# Altium footprint library 3.Inductors&Transformers.PcbLib: 51 footprints (part 1 of 4)
Each footprint in its own frame and in the unit in brackets; x right, y up, seen from the top. Pads: shape width x height; smd on the part's side, far side on the other; paste and mask are expansions set on the pad; w line width, h text height; cw(c..) or ccw(c..) is an arc to the next point about the centre after c.
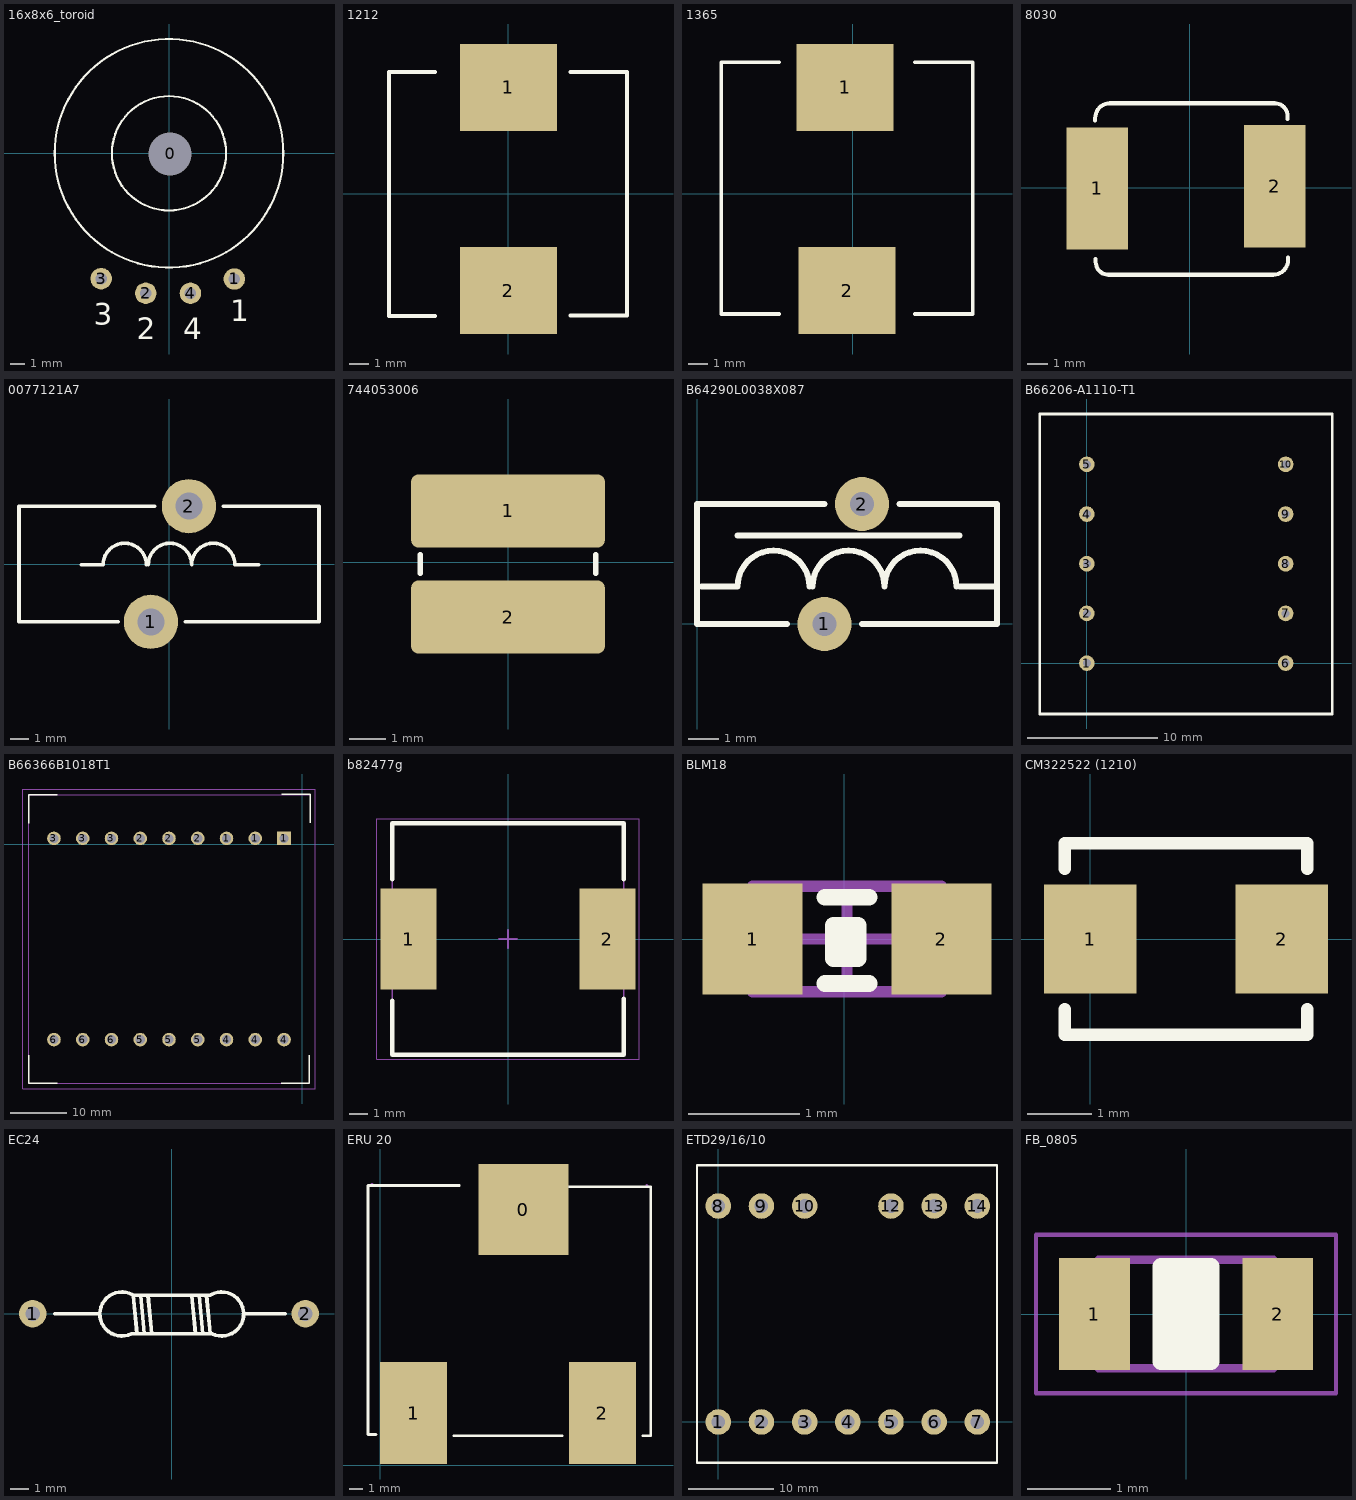
[diagram p0: the footprints below, top view; thin cyan lines are the x and y axes]

## 16x8x6_toroid [mm]
pads (5):
  round 1.5 hole 3: 0(0.075,-0.05)
  round 1.5 hole 0.8: 1(4.575,-8.8) 2(-1.625,-9.8) 3(-4.75,-8.775) 4(1.5,-9.8)
Top Overlay:
  circle w0.15: c0,0 r4
  circle w0.15: c0,0 r8
  text "4" at 1,-13 h1.5
  text "3" at -5.275,-12 h1.5
  text "2" at -2.25,-13 h1.5
  text "1" at 4.3,-11.775 h1.5

## 1212 [mm]
pads (2):
  rect 5x4.5 smd: 1(0,5.5) 2(0,-5)
Top Overlay:
  lines w0.2: -3.8,-6.305 -6.176,-6.305 -6.176,6.3 -3.8,6.3 ; 3.2,-6.295 6.134,-6.295 6.134,6.3 3.2,6.3
3D body "SUMIDA-CDRH127.step": height 7.5, standoff 0.05, extent -6,-6.171 6,6.171

## 1365 [mm]
pads (2):
  rect 5x4.5 smd: 1(-0.4,5.5) 2(-0.3,-5)
Top Overlay:
  lines w0.2: -3.8,-6.2 -6.8,-6.2 -6.8,6.8 -3.8,6.8 ; 3.2,-6.2 6.2,-6.2 6.2,6.8 3.2,6.8
3D body "User Library-744355047.STEP": height 4.72, standoff -0.09, extent -6.7,-6.1 6.1,6.9

## 8030 [mm]
pads (2):
  rect 3x6 smd: 1(-4.525,-0.025) 2(4.175,0.075)
Top Overlay:
  lines w0.2: -4.625,3.3 -4.625,3.425 cw(c-3.9,3.425) -3.9,4.15 4.175,4.15 cw(c4.175,3.525) 4.8,3.525 4.8,3.375 ; -4.6,-3.475 -4.6,-3.625 ccw(c-3.975,-3.625) -3.975,-4.25 4.1,-4.25 ccw(c4.1,-3.525) 4.825,-3.525 4.825,-3.4
3D body "STEP-WE-LHMI-8030-rev1.stp": height 3.05, standoff 0.05, extent -4.625,-4.025 4.825,4.175

## 0077121A7 [mm]
pads (2):
  round 3 hole 1.5: 1(-1,-3.2) 2(1.1,3.2)
Top Overlay:
  lines w0.2: -4.85,-0.05 -3.65,-0.05 cw(c-2.45,-0.05) -1.25,-0.05 ; -2.8,-3.2 -8.3,-3.2 -8.3,3.2 -0.8,3.2 ; -1.15,-0.05 cw(c0.05,-0.05) 1.25,-0.05 cw(c2.45,-0.05) 3.65,-0.05 ; 0.9,-3.2 8.3,-3.2 8.3,3.2 3,3.2 ; 3.75,-0.05 4.95,-0.05

## 744053006 [mm] "WE-TPC SMD Shielded Tiny Power Inductor"
pads (2):
  rrect20% 5.3x2 smd: 1(0,1.4) 2(0,-1.5)
Top Overlay:
  lines w0.15: -2.4,-0.3 -2.4,0.2 ; 2.4,-0.3 2.4,0.2
3D body: height 1.9, standoff 0, extent -2.4,-2.45 2.4,2.35

## B64290L0038X087 [mm]
pads (2):
  round 1.8 hole 0.8: 1(4.25,0) 2(5.5,4)
Top Overlay:
  lines w0.2: 0.15,1.25 1.35,1.25 cw(c2.55,1.25) 3.75,1.25 ; 1.35,2.95 8.75,2.95 ; 3,0 0,0 0,4 4.25,4 ; 3.85,1.25 cw(c5.05,1.25) 6.25,1.25 cw(c7.45,1.25) 8.65,1.25 ; 5.5,0 10,0 10,4 6.75,4 ; 8.75,1.25 9.95,1.25
3D body "B64290L0038X087.stp": height 10.99, standoff 1.01, extent 0,0.01 10,3.99

## B66206-A1110-T1 [mm]
pads (10):
  round 1.2 hole 0.6: 1(0,0) 2(0,3.81) 3(0,7.62) 4(0,11.43) 5(0,15.24) 6(15.24,0) 7(15.24,3.81) 8(15.24,7.62) 9(15.24,11.43) 10(15.24,15.24)
Top Overlay:
  lines w0.2: -3.6,-3.9 -3.6,19.1 18.8,19.1 18.8,-3.9 -3.6,-3.9
3D body "User Library-Ensamblaje.STEP": height 16.72, standoff -3.48, extent -3.638,-3.9 18.838,19.117

## B66366B1018T1 [mm]
pads (18):
  round 2.4 hole 1.6: 1(-13.36,1) 1(-8.28,1) 2(-28.6,1) 2(-23.52,1) 2(-18.44,1) 3(-43.84,1) 3(-38.76,1) 3(-33.68,1) 4(-13.36,-34.56) 4(-8.28,-34.56) 4(-3.2,-34.56) 5(-28.6,-34.56) 5(-23.52,-34.56) 5(-18.44,-34.56) 6(-43.84,-34.56) 6(-38.76,-34.56) 6(-33.68,-34.56)
  rect 2.4x2.4 hole 1.6: 1(-3.2,1)
Top Overlay:
  lines w0.254: -48.3,-37.3 -48.3,-42.3 -43.3,-42.3 ; -48.3,3.7 -48.3,8.7 -43.3,8.7 ; -3.72,-42.28 1.28,-42.28 1.28,-37.28 ; -3.6,8.8 1.4,8.8 1.4,3.8
Mechanical 13:
  lines w0.1: 1.28,-42.28 -48.32,-42.28 -48.32,8.72 1.28,8.72
Mechanical 15:
  lines w0.1: -49.32,-43.28 -49.32,9.72 2.28,9.72 2.28,-43.28 -49.32,-43.28
3D body "B66366B1018T1.stp": height 38.08, standoff -4.5, extent -48.261,-42.2 1.339,8.8

## b82477g [mm] "Precision Wire Wound Inductor, 2-Leads, Body 12.80x12.80mm, IPC Medium Density"
height 8
pads (2):
  rect 3.1x5.6 smd: 1(-5.5,0) 2(5.5,0)
Top Overlay:
  lines w0.25: -6.4,-3.429 -6.4,-6.4 6.4,-6.4 6.4,-3.302 ; -6.4,3.302 -6.4,6.4 6.4,6.4 6.4,3.302
Mechanical 13:
  lines w0.1: -6.4,-6.4 -6.4,6.4 6.4,6.4 6.4,-6.4 -6.4,-6.4
Mechanical 15:
  lines w0.05: -7.275,-6.65 -7.275,6.65 7.275,6.65 7.275,-6.65 -7.275,-6.65
  lines w0.1: -0.5,0 0.5,0 ; 0,-0.5 0,0.5
3D body "User Library-b82477g4 (1).step": height 8, standoff 0, extent -6.477,-6.4 6.323,6.4

## BLM18 [mm]
pads (2):
  rect 0.9x1 smd: 1(-0.825,0) 2(0.875,0)
Top Overlay:
  lines w0.15: -0.175,-0.4 0.225,-0.4 ; -0.175,0.375 0.225,0.375 ; -0.1,0.125 -0.1,-0.175 0.125,-0.175 0.125,0.125 -0.075,0.125 0.025,-0.1 0.025,0.025 0.025,-0.15
Mechanical 13:
  lines w0.1: -0.825,-0.475 -0.825,0.475 0.875,0.475 0.875,-0.475 -0.825,-0.475
Mechanical 15:
  lines w0.1: -0.45,0 0.5,0 ; 0.025,-0.475 0.025,0.475
3D body "User Library-FB_1608.STEP": height 0.8, standoff 0, extent -0.8,-0.4 0.8,0.4

## CM322522 (1210) [mm]
pads (2):
  rect 1.45x1.7 smd: 1(0,0) 2(3,0)
Top Overlay:
  lines w0.2: -0.4,-1.1 -0.4,-1.5 3.4,-1.5 3.4,-1.1 ; -0.4,1.1 -0.4,1.5 3.4,1.5 3.4,1.1
3D body "User Library-INDM3225X240N.step": height 2.4, standoff 0, extent -0.29,-1.35 3.29,1.35

## EC24 [mm]
pads (2):
  round 1.5 hole 0.8: 1(-7.6,0) 2(7.3,0)
Top Overlay:
  lines w0.2: -6.4,0 -4,0 ; -2.152,1.039 ccw(c-2.728,-0.018) -2.2,-1.1 2.2,-1.1 ccw(c2.728,-0.018) 2.152,1.039 ; -1.9,-1.1 -2.1,1 2.1,1 ; -1.7,1 -1.5,-1.1 ; -1.3,1 -1.1,-1.1 ; 1.1,1 1.3,-1.1 ; 1.5,1 1.7,-1.1 ; 1.9,1 2.1,-1.1 ; 3.9,0 6.2,0
3D body "User Library-EC24.step": height 3, standoff -2, extent -7.94,-1.5 7.8,1.5

## ERU 20 [mm]
pads (3):
  rect 6.7x6.8 smd: 0(10.7,19.1)
  rect 5x7.6 smd: 1(2.5,3.9) 2(16.6,3.9)
Top Overlay:
  lines w0.2: -0.9,5.8 -0.9,2.3 ; -0.3,2.3 -0.9,2.3 ; 5.5,2.2 13.6,2.2 ; 5.9,20.9 -0.9,20.9 -0.9,2.3 ; 14.1,20.8 20.2,20.8 20.2,2.2 19.6,2.2
Mechanical 1:
  lines w0.2: -0.7,20.9 -0.6,21 ; 19.9,20.9 20,20.8
3D body "User Library-B82559.step": height 12.15, standoff 0.01, extent -3.2,0.523 21.8,23.303

## ETD29/16/10 [mm]
pads (13):
  round 3 hole 1.6: 1(0,0) 2(5.08,0) 3(10.16,0) 4(15.24,0) 5(20.32,0) 6(25.4,0) 7(30.48,0) 8(0,25.4) 9(5.08,25.4) 10(10.16,25.4) 12(20.32,25.4) 13(25.4,25.4) 14(30.48,25.4)
Top Overlay:
  lines w0.254: -2.5,-4.8 -2.5,30.2 32.793,30.2 32.793,-4.8 -2.5,-4.8
3D body "User Library-ETD29.STEP": height 22.61, standoff -5.5, extent -2.4,-4.8 32.8,30.2

## FB_0805 [mm] "Chip Resistor, 2-Leads, Body 2,10x1,30mm, IPC Medium Density"
height 0.5
pads (2):
  rect 0.85x1.35 smd: 1(-1.1,0) 2(1.1,0)
Top Overlay:
  rectangle: -0.4,-0.575 0.4,0.575
  lines w0.1: -0.3,-0.575 0.3,-0.575
  lines w0.2: -0.3,-0.575 0.3,-0.575 ; -0.3,0.575 0.3,0.575
Mechanical 13:
  lines w0.1: -1.05,-0.65 -1.05,0.65 1.05,0.65 1.05,-0.65 -1.05,-0.65
Mechanical 15:
  lines w0.05: -1.8,-0.95 -1.8,0.95 1.8,0.95 1.8,-0.95 -1.8,-0.95
3D body "User Library-FB_2012.STEP": height 0.85, standoff 0, extent -1,-0.625 1,0.625